# Altium footprint library PCBLIB.PcbLib: 775 footprints (part 24 of 49)
Each footprint in its own frame and in the unit in brackets; x right, y up, seen from the top. Pads: shape width x height; smd on the part's side, far side on the other; paste and mask are expansions set on the pad; w line width, h text height; cw(c..) or ccw(c..) is an arc to the next point about the centre after c.
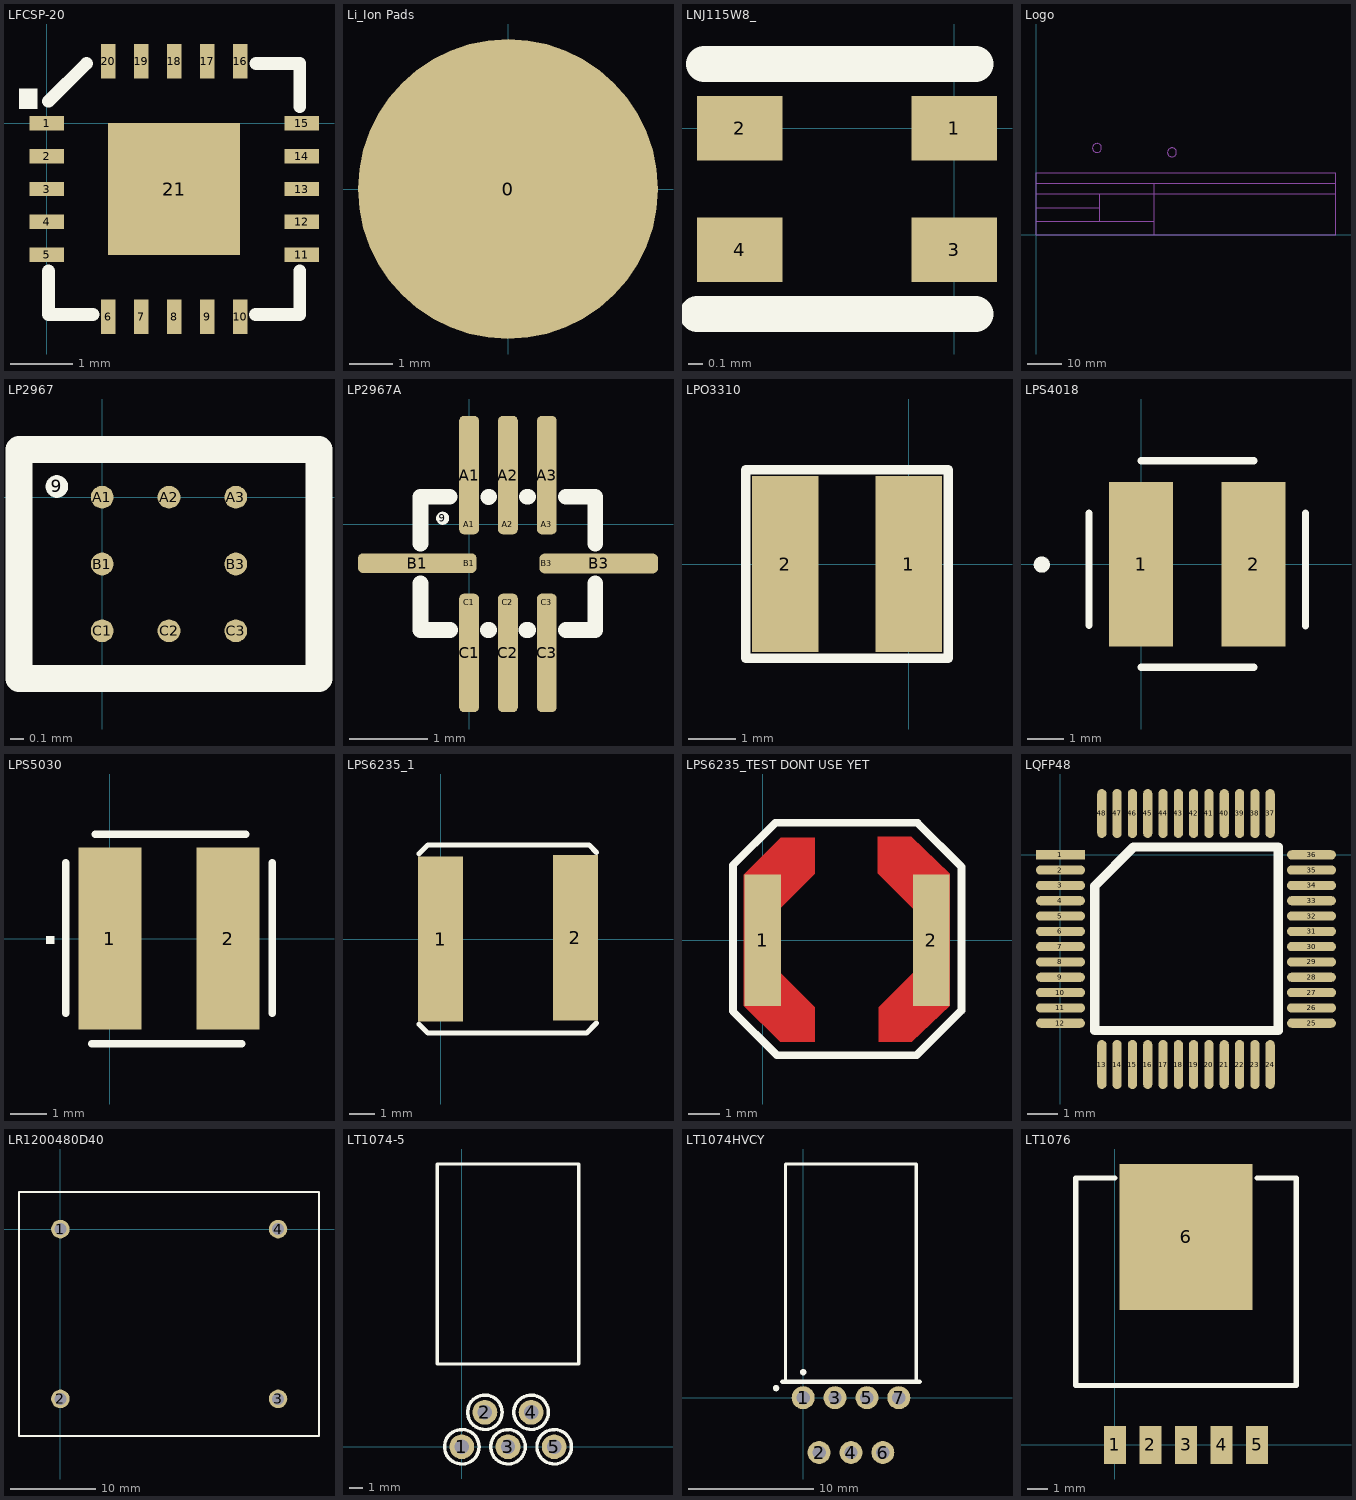
[diagram p23: the footprints below, top view; thin cyan lines are the x and y axes]

## LFCSP-20 [mm]
height 1
pads (21):
  rect 0.55x0.23 smd: 1(0,0) 2(0,-0.525) 3(0,-1.05) 4(0,-1.575) 5(0,-2.1) 11(4.064,-2.1) 12(4.064,-1.575) 13(4.064,-1.05) 14(4.064,-0.525) 15(4.064,0)
  rect 0.23x0.55 smd: 6(0.982,-3.082) 7(1.507,-3.082) 8(2.032,-3.082) 9(2.557,-3.082) 10(3.082,-3.082) 16(3.082,0.982) 17(2.557,0.982) 18(2.032,0.982) 19(1.507,0.982) 20(0.982,0.982)
  rect 2.1x2.1 smd: 21(2.032,-1.05)
TopOverlay:
  rectangle: -0.438,0.227 -0.14,0.554
  lines w0.203: 0.032,-2.356 0.032,-3.05 0.739,-3.05 ; 0.032,0.347 0.635,0.95 ; 3.329,-3.05 4.032,-3.05 4.032,-2.356 ; 3.338,0.95 4.032,0.95 4.032,0.261

## Li_Ion Pads [mil]
pads (1):
  round 270 smd: 0(0,0)

## LNJ115W8_ [mm]
height 1.75
pads (4):
  rect 0.6x0.45 smd: 1(0,0) 2(-1.5,0) 3(0,-0.85) 4(-1.5,-0.85)
TopOverlay:
  lines w0.254: -1.8,-1.3 0.15,-1.3 ; -1.75,0.45 0.15,0.45
  text "." at 0.534,0.327 h0.89

## Logo [mil]
Mechanical2:
  circle w8: c691,981 r50.99
  circle w8: c1541,931 r50.99
  lines w8: 0,302 721,302 ; 0,581 3400,581 ; 0,700 0,0 3400,0 3400,700 ; 721,148 721,461 ; 1342,0 1342,581
  lines w10: 0,148 1342,148 ; 0,461 3400,461 ; 0,700 3400,700
  text "DESCRIPTION:" at 15,607 h60
  text "0" at 0,0 h1
  text "SUBSITE" at 1,861 h90
  text "R" at 681,961 h40
  text "R" at 1531,911 h40
  text "A Ditch Witch Product" at 791,801 h60
  text "PART # :" at 17,491 h60
  text "VERSION" at 740,375 h60
  text "DRAWN BY:" at 20,341 h60
  text "CHK'D :" at 32,205 h60
  text ".DATE_PRINT" at 26,31 h60
  text ".TIME_PRINT" at 791,26 h60
  text "APPR'VD BY & DATE :" at 1371,371 h60
  text "DESIGN COMP. DATE :" at 1373,497 h50
Mechanical4:
  text "0" at 0,0 h1

## LP2967 [mm]
height 0.5
pads (9):
  round 0.17 on Top Overlay: 9(-0.34,0.08)
  round 0.17 smd: A1(0,0) A2(0.5,0) A3(1,0) B1(0,-0.5) B3(1,-0.5) C1(0,-1) C2(0.5,-1) C3(1,-1)
TopOverlay:
  lines w0.203: -0.623,-1.356 -0.623,0.356 1.623,0.356 1.623,-1.356 -0.623,-1.356

## LP2967A [mm]
height 0.5
pads (17):
  round 0.17 on Top Overlay: 9(-0.34,0.08)
  round 0.17 smd: A1(0,0) A2(0.5,0) A3(1,0) B1(0,-0.5) B3(1,-0.5) C1(0,-1) C2(0.5,-1) C3(1,-1)
  rrect50% 0.254x1.524 smd: A1(0,0.635) A2(0.5,0.635) A3(1,0.635) C1(0,-1.651) C2(0.5,-1.651) C3(1,-1.651)
  rrect50% 1.524x0.254 smd: B1(-0.666,-0.498) B3(1.667,-0.501)
TopOverlay:
  lines w0.203: -0.623,-0.757 -0.623,-1.356 -0.246,-1.356 ; -0.623,-0.246 -0.623,0.356 -0.25,0.356 ; 0.243,-1.356 0.258,-1.356 ; 0.251,0.353 0.258,0.356 ; 0.74,-1.356 0.762,-1.356 ; 0.743,0.356 0.758,0.356 ; 1.247,-1.356 1.623,-1.356 1.623,-0.757 ; 1.247,0.356 1.623,0.356 1.623,-0.246

## LPO3310 [mil]
pads (2):
  rect 56x148 smd: 1(0,0) 2(-104,0)
TopOverlay:
  lines w8: -137,-79 -137,79 33,79 33,-79 -137,-79

## LPS4018 [mil]
pads (2):
  rect 70x180 smd: 1(0,0) 2(123,0)
TopOverlay:
  circle w5: c-108.67,-0.16 r6.42
  circle w5: c-108.8,-0.16 r1.66
  lines w8: -57.15,-66.91 -57.15,56.09 ; 0.06,-112.31 123.06,-112.31 ; 0.06,113.21 123.06,113.21 ; 179.58,-66.97 179.58,56.03

## LPS5030 [mil]
pads (2):
  rect 68.5x197 smd: 1(0,0) 2(128,0)
TopOverlay:
  rectangle: -69,-6 -60,3
  lines w8: -48,-81 -48,82 ; -20,-114 143,-114 ; -16,113 147,113 ; 176,-81 176,82

## LPS6235_1 [mm] "Shielded SMT Power Inductors"
height 3.5
pads (2):
  rect 1.8x6.6 smd: 1(0,0) 2(5.375,0.051)
TopOverlay:
  lines w0.203: -0.864,-3.404 -0.508,-3.759 5.817,-3.759 6.223,-3.353 ; -0.864,3.404 -0.508,3.759 5.918,3.759 6.223,3.454

## LPS6235_TEST DONT USE YET [mil] "Shielded SMT Power Inductors"
height 140
pads (2):
  rect 46.5x167 smd: 1(0,0) 2(213.5,0)
TopLayer:
  region: 146,131 188,131 237,84 237,-83 189,-129 147,-129 147,-85 191,-41 191,40 146,85
  region: 66,-129 22,-129 -24,-83 -24,83 23,130 66,130 66,84 21,39 21,-40 66,-85
TopOverlay:
  lines w10: -38,-90 18,-146 195,-146 252,-89 252,93 196,149 16,149 -38,95 -38,-90
TopPaste:
  region: 146,131 188,131 237,84 237,-83 189,-129 147,-129 147,-85 191,-41 191,40 146,85
  region: 66,-129 22,-129 -24,-83 -24,83 23,130 66,130 66,84 21,39 21,-40 66,-85
TopSolder:
  region: 142,136 191,136 242,88 242,-86 192,-134 142,-134 142,-85 186,-40 186,39 142,82
  region: 71,-134 20,-134 -28,-86 -27,88 18,134 72,134 72,83 27,38 27,-41 71,-83

## LQFP48 [mm]
pads (48):
  rect 1.6x0.3 smd: 1(0,0)
  oval 1.6x0.3 smd: 2(0,-0.5) 3(0,-1) 4(0,-1.5) 5(0,-2) 6(0,-2.5) 7(0,-3) 8(0,-3.5) 9(0,-4) 10(0,-4.5) 11(0,-5) 12(0,-5.5) 25(8.2,-5.5) 26(8.2,-5) 27(8.2,-4.5) 28(8.2,-4) 29(8.2,-3.5) 30(8.2,-3) 31(8.2,-2.5) 32(8.2,-2) 33(8.2,-1.5) 34(8.2,-1) 35(8.2,-0.5) 36(8.2,0)
  oval 0.3x1.6 smd: 13(1.35,-6.85) 14(1.85,-6.85) 15(2.35,-6.85) 16(2.85,-6.85) 17(3.35,-6.85) 18(3.85,-6.85) 19(4.35,-6.85) 20(4.85,-6.85) 21(5.35,-6.85) 22(5.85,-6.85) 23(6.35,-6.85) 24(6.85,-6.85) 37(6.85,1.35) 38(6.35,1.35) 39(5.85,1.35) 40(5.35,1.35) 41(4.85,1.35) 42(4.35,1.35) 43(3.85,1.35) 44(3.35,1.35) 45(2.85,1.35) 46(2.35,1.35) 47(1.85,1.35) 48(1.35,1.35)
TopOverlay:
  lines w0.305: 1.118,-5.74 1.118,-5.512 1.118,-1.016 2.388,0.254 7.112,0.254 7.112,-5.74 1.118,-5.74
  text "." at -1.473,-0.127 h1.52
Mechanical4:
  text ".065" at 0,0 h0.03

## LR1200480D40 [mil]
height 250
pads (4):
  round 85 hole 55: 1(0,0) 2(0,-780) 3(1000,-780) 4(1000,0)
TopOverlay:
  lines w10: -190,-950 1188.03,-950 1188.03,167.97 ; -190,-948.1 -190,170 1188.03,170

## LT1074-5 [mil]
pads (5):
  round 72 hole 42: 1(0,0) 2(67,100) 3(134,0) 4(201,100) 5(268,0)
TopOverlay:
  circle w10: c0,0 r50
  circle w10: c67,100 r50
  circle w10: c201,100 r50
  circle w10: c268,0 r50
  circle w10: c134,0 r50
  lines w10: -71,240 -71,820 339,820 339,240 -71,240
Mechanical4:
  text ".175" at 0,0 h1

## LT1074HVCY [mil]
pads (7):
  round 72 hole 42 unplated: 1(0,0) 2(50,-172) 3(100,0) 4(150,-172) 5(200,0) 6(250,-172) 7(300,0)
TopOverlay:
  circle w10: c-85,30 r5
  circle w10: c0,80 r5
  lines w10: -55,50 -55,733 355,733 355,50
  lines w15: -65,50 365,50
Mechanical4:
  text ".175" at 0,0 h1

## LT1076 [mil]
pads (6):
  rect 42x72 smd: 1(0,0) 2(67,0) 3(134,0) 4(201,0) 5(268,0)
  rect 250x275 smd: 6(134,392)
TopOverlay:
  lines w10: 0,503 -74,503 -74,112 342,112 342,503 268,503
Mechanical4:
  text ".175" at 0,0 h1